# Altium footprint library AD_Lib.PcbLib: 508 footprints (part 16 of 32)
Each footprint in its own frame and in the unit in brackets; x right, y up, seen from the top. Pads: shape width x height; smd on the part's side, far side on the other; paste and mask are expansions set on the pad; w line width, h text height; cw(c..) or ccw(c..) is an arc to the next point about the centre after c.
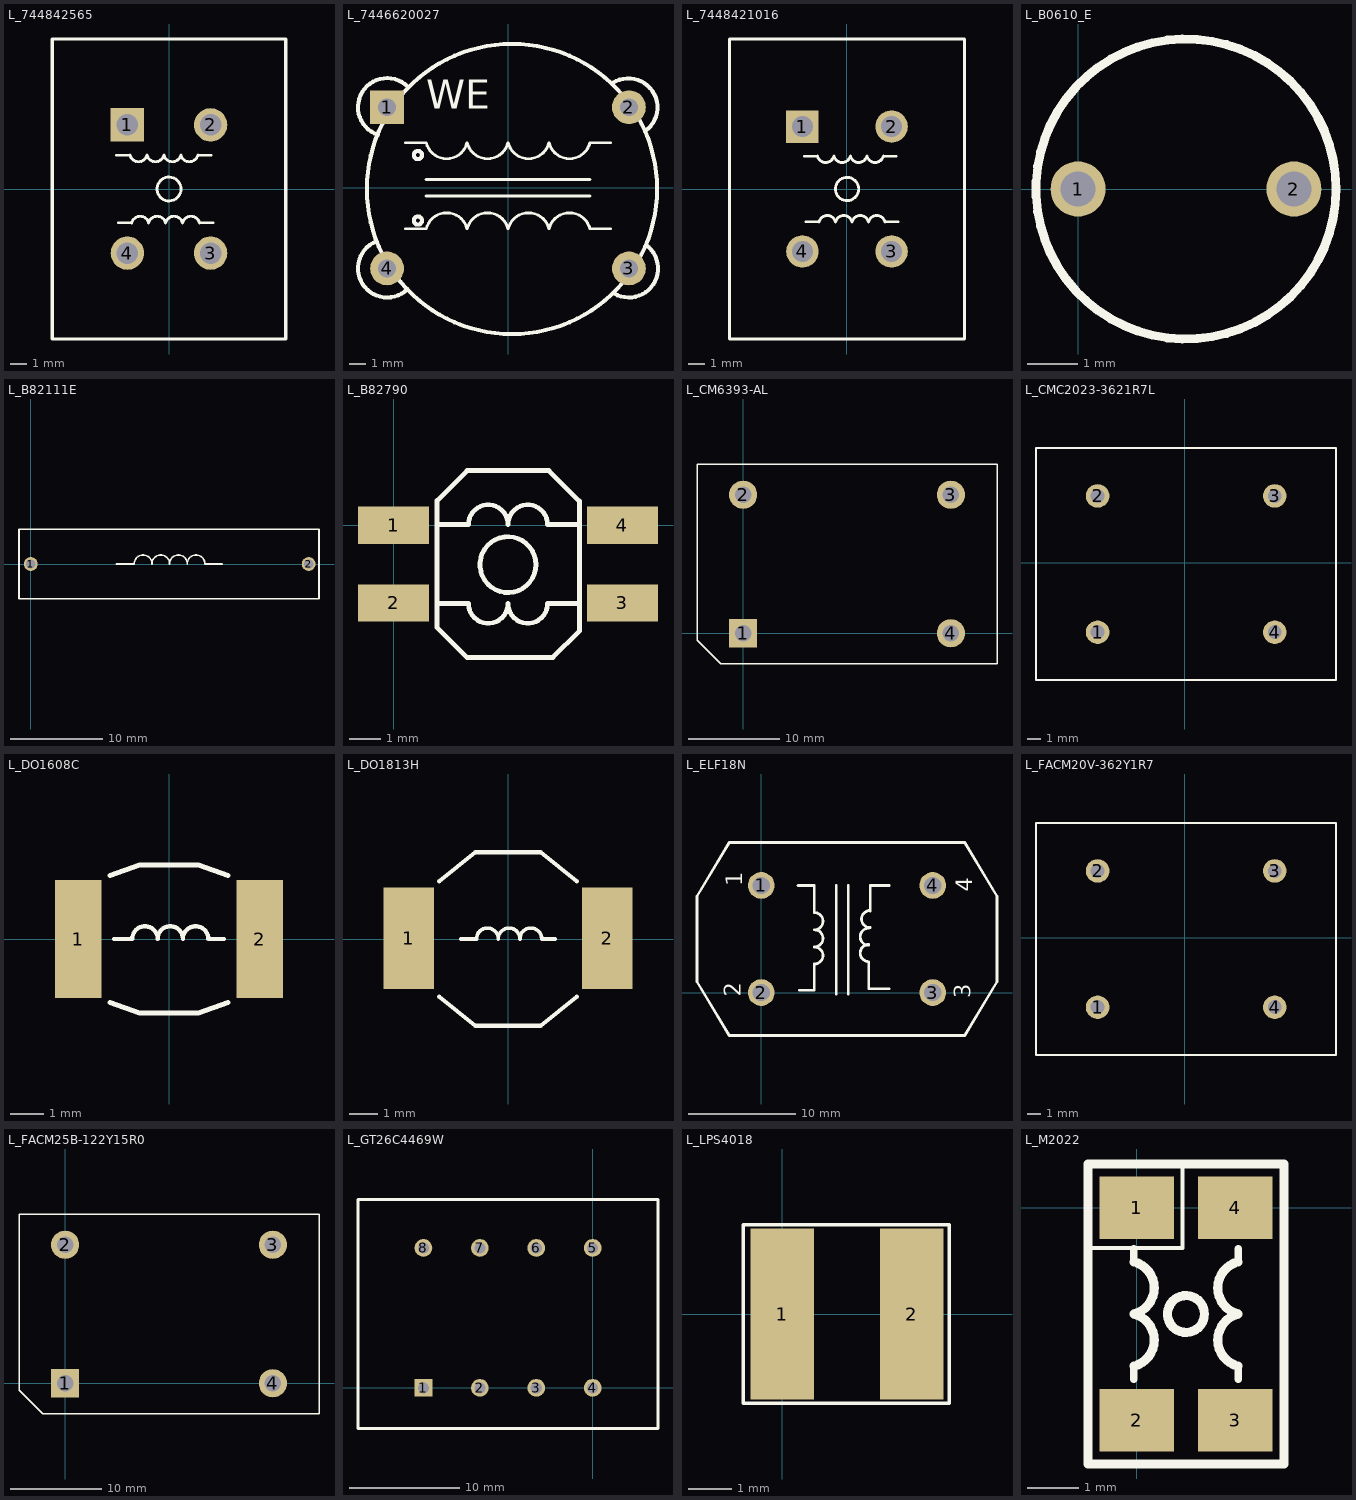
[diagram p15: the footprints below, top view; thin cyan lines are the x and y axes]

## L_744842565 [mm] "Wurth共模电感"
height 22
pads (4):
  rect 2x2 hole 1.3: 1(-2.5,3.85)
  round 2 hole 1.3: 2(2.5,3.85) 3(2.5,-3.85) 4(-2.5,-3.85)
Top Overlay:
  circle w0.178: c0,0 r0.718
  lines w0.152: -3.15,2.032 -2.337,2.032 ; -3.048,-2.032 -2.235,-2.032 ; 1.727,2.032 2.54,2.032 ; 1.829,-2.032 2.642,-2.032
  lines w0.178: -2.337,2.032 ccw(c-1.829,2.159) -1.321,2.032 ccw(c-0.813,2.159) -0.305,2.032 ccw(c0.203,2.159) 0.711,2.032 ccw(c1.219,2.159) 1.727,2.032 ; -2.235,-2.032 cw(c-1.727,-2.159) -1.219,-2.032 cw(c-0.711,-2.159) -0.203,-2.032 cw(c0.305,-2.159) 0.813,-2.032 cw(c1.321,-2.159) 1.829,-2.032
  lines w0.203: -7,-9 -7,9 7,9 7,-9 -7,-9

## L_7446620027 [mm] "Wurth共模电感"
height 22
pads (4):
  rect 2.1x2.1 hole 1.1: 1(-7.5,5)
  round 2.1 hole 1.1: 2(7.5,5) 3(7.5,-5) 4(-7.5,-5)
Top Overlay:
  circle w0.254: c0.247,-0.073 r9
  circle w0.254: c-5.588,-2.032 r0.254
  circle w0.254: c-5.588,2.032 r0.254
  lines w0.178: -6.35,-2.54 -5.073,-2.54 cw(c-3.807,-2.857) -2.54,-2.54 ; -6.35,2.794 -5.073,2.794 ccw(c-3.807,3.111) -2.54,2.794 ; -5.08,-0.508 5.08,-0.508 ; -5.08,0.508 5.08,0.508 ; -2.533,-2.54 cw(c-1.267,-2.857) 0,-2.54 ; -2.533,2.794 ccw(c-1.267,3.111) 0,2.794 ; 0.007,-2.54 cw(c1.273,-2.857) 2.54,-2.54 ; 0.007,2.794 ccw(c1.273,3.111) 2.54,2.794 ; 2.547,-2.54 cw(c3.813,-2.857) 5.08,-2.54 6.357,-2.54 ; 2.547,2.794 ccw(c3.813,3.111) 5.08,2.794 6.357,2.794
  lines w0.254: -8.159,-3.321 ccw(c-7.5,-5) -6.241,-6.291 ; -8.07,3.289 cw(c-7.5,5) -6.225,6.275 ; 6.485,6.501 cw(c7.464,4.986) 8.485,3.5 ; 6.595,-6.56 ccw(c7.5,-5) 8.568,-3.547
  text "WE" at -5.08,4.318 h3.05

## L_7448421016 [mm] "Wurth共模电感"
height 22
pads (4):
  rect 2x2 hole 1.3: 1(-2.75,3.85)
  round 2 hole 1.3: 2(2.75,3.85) 3(2.75,-3.85) 4(-2.75,-3.85)
Top Overlay:
  circle w0.178: c0.004,0 r0.718
  lines w0.152: -2.638,2.032 -1.825,2.032 ; -2.536,-2.032 -1.723,-2.032 ; 2.239,2.032 3.052,2.032 ; 2.341,-2.032 3.154,-2.032
  lines w0.178: -1.825,2.032 ccw(c-1.317,2.159) -0.809,2.032 ccw(c-0.301,2.159) 0.207,2.032 ccw(c0.715,2.159) 1.223,2.032 ccw(c1.731,2.159) 2.239,2.032 ; -1.723,-2.032 cw(c-1.215,-2.159) -0.707,-2.032 cw(c-0.199,-2.159) 0.309,-2.032 cw(c0.817,-2.159) 1.325,-2.032 cw(c1.833,-2.159) 2.341,-2.032
  lines w0.203: -7.25,-9.25 -7.25,9.25 7.25,9.25 7.25,-9.25 -7.25,-9.25

## L_B0610_E [mm] "磁珠，立式"
height 6
pads (2):
  round 1.1 hole 0.7: 1(0,0) 2(4.318,0)
Top Overlay:
  circle w0.178: c2.159,0 r3

## L_B82111E [mm] "TDK电感，B82111E系列"
height 6
pads (2):
  round 1.5 hole 1: 1(0,0) 2(30,0)
Top Overlay:
  lines w0.178: 9.258,0 11.163,0 ; 11.161,0 cw(c12.128,0) 13.095,0 ; 13.066,0 cw(c14.033,0) 15,0 ; 14.971,0 cw(c15.938,0) 16.905,0 ; 16.876,0 cw(c17.843,0) 18.81,0 ; 18.783,0 20.688,0 ; -1.27,-3.75 -1.27,3.75 31.115,3.75 31.115,-3.75 -1.27,-3.75

## L_B82790 [mm] "EPCOS共模电感"
height 5.2
pads (4):
  rect 2.285x1.2 smd: 1(0,0) 2(0,-2.5) 3(7.35,-2.5) 4(7.35,0)
Top Overlay:
  circle w0.152: c3.674,-1.27 r0.898
  lines w0.152: 1.397,-2.52 2.405,-2.52 ccw(c3.04,-2.52) 3.675,-2.52 ccw(c4.31,-2.52) 4.945,-2.52 5.969,-2.52 ; 1.397,0.02 2.405,0.02 cw(c3.04,0.02) 3.675,0.02 cw(c4.31,0.02) 4.945,0.02 5.969,0.02 ; 1.397,-3.29 1.397,0.79 2.36,1.753 4.99,1.753 5.969,0.774 5.969,-3.401 5.12,-4.25 2.357,-4.25 1.397,-3.29

## L_CM6393-AL [mil] "定制电感"
pads (4):
  rect 122x122 hole 72: 1(0,0)
  round 122 hole 72: 2(0,600) 3(900,600) 4(900,0)
Top Overlay:
  lines w6: -199.63,-30.37 -199.63,733 1099.63,733 1099.63,-133 -97,-133 -199.63,-30.37
Mechanical 8:
  text "4" at 910,600 h25

## L_CMC2023-3621R7L [mil] "定制电感"
pads (4):
  round 68 hole 40: 1(-252.5,-200) 2(-252.5,193.7) 3(259.5,193.7) 4(259.5,-200)
Top Overlay:
  lines w6: -430.5,-338 -430.5,332 436.5,332 436.5,-338 -430.5,-338
Mechanical 8:
  text "1" at -242.5,-200 h25
  text "2" at -242.5,193.7 h25
  text "3" at 269.5,193.7 h25

## L_DO1608C [mm] "Coilcraft之DO1608C系列电感.，如DO1608C-333_L"
height 2.92
pads (2):
  rect 1.4x3.56 smd paste-0.051 mask+0.076: 1(-2.73,0) 2(2.73,0)
Top Overlay:
  lines w0.127: -1.651,0 -1.143,0 ; -1.107,0 cw(c-0.724,0) -0.341,0 ; -0.345,0 cw(c0.038,0) 0.421,0 ; 0.417,0 cw(c0.8,0) 1.183,0 1.651,0
  lines w0.152: -1.778,-1.905 -0.89,-2.225 0.89,-2.225 1.778,-1.905 ; -1.778,1.905 -0.89,2.225 0.89,2.225 1.778,1.905

## L_DO1813H [mil] "Coilcraft之DO1813H系列电感.，如DO1813H-103ML"
height 196.85
pads (2):
  rect 70x140 smd paste-2 mask+3: 1(-137.4,1) 2(137.4,1)
Top Overlay:
  lines w5: -65,0 -45,0 ; -43.58,0 cw(c-28.5,0) -13.43,0 ; -13.58,0 cw(c1.5,0) 16.57,0 ; 16.42,0 cw(c31.5,0) 46.57,0 65,0
  lines w6: -95,-80 -45.28,-120.08 45.28,-120.08 95,-80 ; -95,80 -45.28,120.08 45.28,120.08 95,80

## L_ELF18N [mm] "电源线共模电感"
height 32.5
pads (4):
  round 2.5 hole 1.6: 1(0,10) 2(0,0) 3(16,0) 4(16,10)
Top Overlay:
  lines w0.254: 3.429,10 4.953,10 4.953,7.46 cw(c4.953,6.66) 4.953,5.86 cw(c4.953,5.06) 4.953,4.26 cw(c4.953,3.46) 4.953,2.66 4.953,0.247 ; 3.556,0.221 4.953,0.221 ; 6.985,-0.16 6.985,10 ; 8.128,-0.16 8.128,10 ; 10.033,4.412 cw(c10.033,5.212) 10.033,6.012 ; 10.033,4.488 ccw(c10.033,3.688) 10.033,2.888 10.033,0.348 11.938,0.348 ; 10.16,6.063 cw(c10.16,6.863) 10.16,7.663 ; 10.16,7.587 10.16,10 11.938,10 ; -6,1 -6,9 -3,14 19,14 22,9 22,1 19,-4 -3,-4 -6,1
  text "1" at -1.778,9.906 h1.52
  text "2" at -1.905,-0.381 h1.52
  text "3" at 19.558,-0.508 h1.52
  text "4" at 19.685,9.398 h1.52

## L_FACM20V-362Y1R7 [mil] "定制电感"
pads (4):
  round 68 hole 40: 1(-252.5,-200) 2(-252.5,193.7) 3(259.5,193.7) 4(259.5,-200)
Top Overlay:
  lines w6: -430.5,-338 436.5,-338 436.5,332 -430.5,332 -430.5,-338
Mechanical 8:
  text "3" at 269.5,193.7 h25
  text "2" at -242.5,193.7 h25
  text "1" at -242.5,-200 h25

## L_FACM25B-122Y15R0 [mil] "定制电感"
pads (4):
  rect 122x122 hole 72: 1(0,0)
  round 122 hole 72: 2(0,600) 3(900,600) 4(900,0)
Top Overlay:
  lines w6: -199.63,-30.37 -199.63,733 1099.63,733 1099.63,-133 -97,-133 -199.63,-30.37
Mechanical 8:
  text "4" at 910,600 h25

## L_GT26C4469W [mm] "定制电感"
height 30
pads (8):
  rect 1.6x1.6 hole 1: 1(-15.3,0)
  round 1.6 hole 1: 2(-10.2,0) 3(-5.1,0) 4(0,0) 5(0,12.64) 6(-5.1,12.64) 7(-10.2,12.64) 8(-15.3,12.64)
Top Overlay:
  lines w0.254: -21.21,-3.69 -18.481,-3.69 5.9,-3.69 5.9,17.006 ; -21.21,-3.658 -21.209,16.993 ; -21.209,17.03 5.9,17.03

## L_LPS4018 [mm] "Coilcraft之LPS4018系列电感.，如LPS4018-333MRB"
height 1.8
pads (2):
  rect 1.45x3.89 smd paste-0.051 mask+0.076: 1(0,0) 2(2.95,0)
Top Overlay:
  lines w0.076: -0.889,-2.032 -0.889,0 -0.889,2.032 3.81,2.032 3.81,-2.032 -0.889,-2.032

## L_M2022 [mm] "Coilcraft之M2022系列共模电感"
height 3.43
pads (4):
  rect 1.45x1.22 smd: 1(0,0) 2(0,-4.14) 3(1.91,-4.14) 4(1.91,0)
Top Overlay:
  circle w0.178: c0.955,-2.07 r0.359
  lines w0.076: -0.95,-0.787 0.889,-0.787 0.889,0.851
  lines w0.152: -0.061,-3.34 -0.061,-3.086 ; -0.061,-1.054 -0.061,-0.8 ; 1.971,-3.34 1.971,-3.086 ; 1.971,-1.054 1.971,-0.8
  lines w0.178: -0.061,-3.086 ccw(c-0.188,-2.578) -0.061,-2.07 ccw(c-0.188,-1.562) -0.061,-1.054 ; 1.971,-3.086 cw(c2.098,-2.578) 1.971,-2.07 cw(c2.098,-1.562) 1.971,-1.054 ; -0.95,-4.991 -0.95,0.851 2.86,0.851 2.86,-4.991 -0.95,-4.991